# Altium schematic symbol library jlcpcb_2025_04_inductors_extended_0402.schlib: 1396 symbols (part 7 of 8)
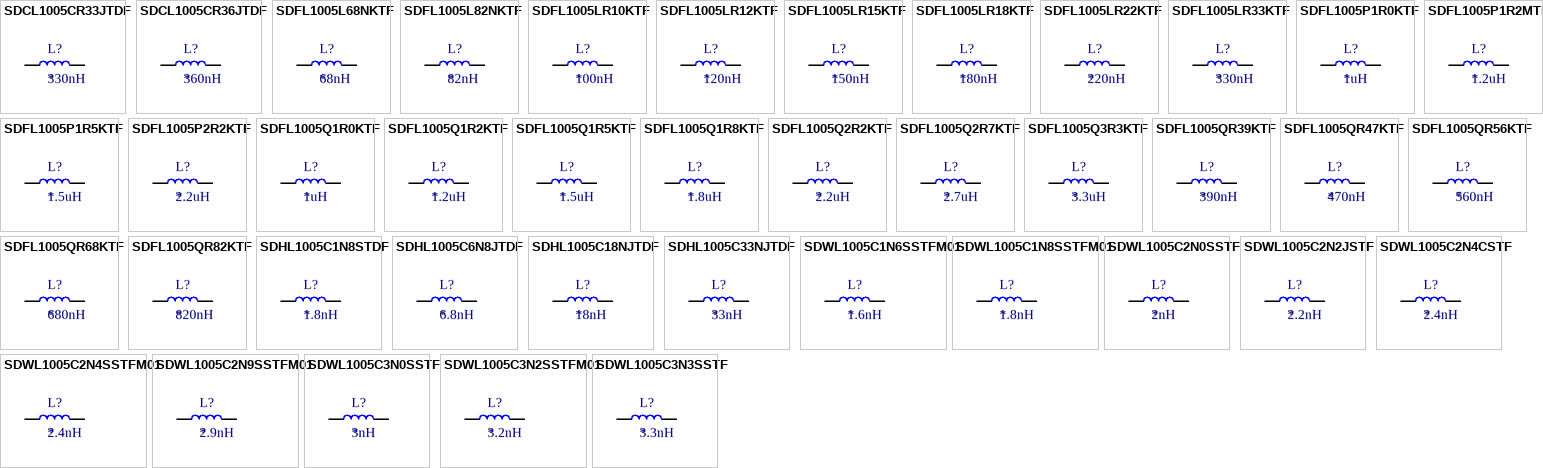
[diagram p40: symbols SDCL1005CR33JTDF to SDWL1005C3N3SSTF]

## SDCL1005CR33JTDF
designator L?  Inductance: 330nH
Inductor, 330nH, ±5%, 7Ω, 50mA, SMD 0402; Manufacturer: Sunlord; Manufacturer Part Number: SDCL1005CR33JTDF; Self-Resonant Frequency: 50MHz; Q Factor: 6@50MHz; Package Size: 0402; JLCPCB Basic Part: No; JLCPCB Part Number: C89954; Supplier 1: LCSC; Category: Inductors; Supplier Part Number 1: C89954; Tolerance: ±5%; Rated Current: 50mA; DC Resistance: 7Ω; RoHS: Yes; ComponentLink1Description: Datasheet; ComponentLink1URL: https://wmsc.lcsc.com/wmsc/upload/file/pdf/v2/lcsc/2310301641_Sunlord-SDCL1005CR33JTDF_C89954.pdf; ComponentLink2Description: JLCPCB Part URL; ComponentLink2URL: https://jlcpcb.com/partdetail/C89954; ComponentLink3Description: LCSC Part URL; ComponentLink3URL: https://lcsc.com/product-detail/Inductors-SMD_Sunlord-Sunlord-SDCL1005CR33JTDF_C89954.html
footprint IND-0402 (0402 (1005M) Inductor)
pins: 1, 2

## SDCL1005CR36JTDF
designator L?  Inductance: 360nH
Inductor, 360nH, ±5%, 7.5Ω, 50mA, SMD 0402; Manufacturer: Sunlord; Manufacturer Part Number: SDCL1005CR36JTDF; Package Size: 0402; JLCPCB Basic Part: No; JLCPCB Part Number: C316414; Supplier 1: LCSC; Category: Inductors; Supplier Part Number 1: C316414; Tolerance: ±5%; Rated Current: 50mA; DC Resistance: 7.5Ω; RoHS: Yes; ComponentLink1Description: Datasheet; ComponentLink1URL: https://wmsc.lcsc.com/wmsc/upload/file/pdf/v2/lcsc/2310301641_Sunlord-SDCL1005CR36JTDF_C316414.pdf; ComponentLink2Description: JLCPCB Part URL; ComponentLink2URL: https://jlcpcb.com/partdetail/C316414; ComponentLink3Description: LCSC Part URL; ComponentLink3URL: https://lcsc.com/product-detail/Inductors-SMD_Sunlord-Sunlord-SDCL1005CR36JTDF_C316414.html
footprint IND-0402 (0402 (1005M) Inductor)
pins: 1, 2

## SDFL1005L68NKTF
designator L?  Inductance: 68nH
Inductor, 68nH, ±10%, 450mΩ, 25mA, SMD 0402; Manufacturer: Sunlord; Manufacturer Part Number: SDFL1005L68NKTF; Self-Resonant Frequency: 50MHz; Q Factor: 10@50MHz; Package Size: 0402; JLCPCB Basic Part: No; JLCPCB Part Number: C370258; Supplier 1: LCSC; Category: Inductors; Supplier Part Number 1: C370258; Tolerance: ±10%; Rated Current: 25mA; DC Resistance: 450mΩ; RoHS: Yes; ComponentLink1Description: Datasheet; ComponentLink1URL: https://wmsc.lcsc.com/wmsc/upload/file/pdf/v2/lcsc/2310271724_Sunlord-SDFL1005L68NKTF_C370258.pdf; ComponentLink2Description: JLCPCB Part URL; ComponentLink2URL: https://jlcpcb.com/partdetail/C370258; ComponentLink3Description: LCSC Part URL; ComponentLink3URL: https://lcsc.com/product-detail/Inductors-SMD_Sunlord-Sunlord-SDFL1005L68NKTF_C370258.html
footprint IND-0402 (0402 (1005M) Inductor)
pins: 1, 2

## SDFL1005L82NKTF
designator L?  Inductance: 82nH
Inductor, 82nH, ±10%, 450mΩ, 25mA, SMD 0402; Manufacturer: Sunlord; Manufacturer Part Number: SDFL1005L82NKTF; Self-Resonant Frequency: 200MHz; Q Factor: 10@50MHz; Package Size: 0402; JLCPCB Basic Part: No; JLCPCB Part Number: C2757904; Supplier 1: LCSC; Category: Inductors; Supplier Part Number 1: C2757904; Tolerance: ±10%; Rated Current: 25mA; DC Resistance: 450mΩ; RoHS: Yes; ComponentLink1Description: Datasheet; ComponentLink1URL: https://wmsc.lcsc.com/wmsc/upload/file/pdf/v2/lcsc/2310301641_Sunlord-SDFL1005L82NKTF_C2757904.pdf; ComponentLink2Description: JLCPCB Part URL; ComponentLink2URL: https://jlcpcb.com/partdetail/C2757904; ComponentLink3Description: LCSC Part URL; ComponentLink3URL: https://lcsc.com/product-detail/Inductors-SMD_Sunlord-Sunlord-SDFL1005L82NKTF_C2757904.html
footprint IND-0402 (0402 (1005M) Inductor)
pins: 1, 2

## SDFL1005LR10KTF
designator L?  Inductance: 100nH
Inductor, 100nH, ±10%, 800mΩ, 25mA, SMD 0402; Manufacturer: Sunlord; Manufacturer Part Number: SDFL1005LR10KTF; Self-Resonant Frequency: 25MHz; Q Factor: 10@25MHz; Package Size: 0402; JLCPCB Basic Part: No; JLCPCB Part Number: C370259; Supplier 1: LCSC; Category: Inductors; Supplier Part Number 1: C370259; Tolerance: ±10%; Rated Current: 25mA; DC Resistance: 800mΩ; RoHS: Yes; ComponentLink1Description: Datasheet; ComponentLink1URL: https://wmsc.lcsc.com/wmsc/upload/file/pdf/v2/lcsc/2310301641_Sunlord-SDFL1005LR10KTF_C370259.pdf; ComponentLink2Description: JLCPCB Part URL; ComponentLink2URL: https://jlcpcb.com/partdetail/C370259; ComponentLink3Description: LCSC Part URL; ComponentLink3URL: https://lcsc.com/product-detail/Inductors-SMD_Sunlord-Sunlord-SDFL1005LR10KTF_C370259.html
footprint IND-0402 (0402 (1005M) Inductor)
pins: 1, 2

## SDFL1005LR12KTF
designator L?  Inductance: 120nH
Inductor, 120nH, ±10%, 800mΩ, 25mA, SMD 0402; Manufacturer: Sunlord; Manufacturer Part Number: SDFL1005LR12KTF; Self-Resonant Frequency: 25MHz; Q Factor: 10@25MHz; Package Size: 0402; JLCPCB Basic Part: No; JLCPCB Part Number: C316412; Supplier 1: LCSC; Category: Inductors; Supplier Part Number 1: C316412; Tolerance: ±10%; Rated Current: 25mA; DC Resistance: 800mΩ; RoHS: Yes; ComponentLink1Description: Datasheet; ComponentLink1URL: https://wmsc.lcsc.com/wmsc/upload/file/pdf/v2/lcsc/2310301641_Sunlord-SDFL1005LR12KTF_C316412.pdf; ComponentLink2Description: JLCPCB Part URL; ComponentLink2URL: https://jlcpcb.com/partdetail/C316412; ComponentLink3Description: LCSC Part URL; ComponentLink3URL: https://lcsc.com/product-detail/Inductors-SMD_Sunlord-Sunlord-SDFL1005LR12KTF_C316412.html
footprint IND-0402 (0402 (1005M) Inductor)
pins: 1, 2

## SDFL1005LR15KTF
designator L?  Inductance: 150nH
Inductor, 150nH, ±10%, 900mΩ, 25mA, SMD 0402; Manufacturer: Sunlord; Manufacturer Part Number: SDFL1005LR15KTF; Self-Resonant Frequency: 25MHz; Q Factor: 10@25MHz; Package Size: 0402; JLCPCB Basic Part: No; JLCPCB Part Number: C316411; Supplier 1: LCSC; Category: Inductors; Supplier Part Number 1: C316411; Tolerance: ±10%; Rated Current: 25mA; DC Resistance: 900mΩ; RoHS: Yes; ComponentLink1Description: Datasheet; ComponentLink1URL: https://wmsc.lcsc.com/wmsc/upload/file/pdf/v2/lcsc/2310301641_Sunlord-SDFL1005LR15KTF_C316411.pdf; ComponentLink2Description: JLCPCB Part URL; ComponentLink2URL: https://jlcpcb.com/partdetail/C316411; ComponentLink3Description: LCSC Part URL; ComponentLink3URL: https://lcsc.com/product-detail/Inductors-SMD_Sunlord-Sunlord-SDFL1005LR15KTF_C316411.html
footprint IND-0402 (0402 (1005M) Inductor)
pins: 1, 2

## SDFL1005LR18KTF
designator L?  Inductance: 180nH
Inductor, 180nH, ±10%, 900mΩ, 25mA, SMD 0402; Manufacturer: Sunlord; Manufacturer Part Number: SDFL1005LR18KTF; Self-Resonant Frequency: 120MHz; Q Factor: 10@25MHz; Package Size: 0402; JLCPCB Basic Part: No; JLCPCB Part Number: C2757903; Supplier 1: LCSC; Category: Inductors; Supplier Part Number 1: C2757903; Tolerance: ±10%; Rated Current: 25mA; DC Resistance: 900mΩ; RoHS: Yes; ComponentLink1Description: Datasheet; ComponentLink1URL: https://wmsc.lcsc.com/wmsc/upload/file/pdf/v2/lcsc/2310301641_Sunlord-SDFL1005LR18KTF_C2757903.pdf; ComponentLink2Description: JLCPCB Part URL; ComponentLink2URL: https://jlcpcb.com/partdetail/C2757903; ComponentLink3Description: LCSC Part URL; ComponentLink3URL: https://lcsc.com/product-detail/Inductors-SMD_Sunlord-Sunlord-SDFL1005LR18KTF_C2757903.html
footprint IND-0402 (0402 (1005M) Inductor)
pins: 1, 2

## SDFL1005LR22KTF
designator L?  Inductance: 220nH
Inductor, 220nH, ±10%, 1.2Ω, 25mA, SMD 0402; Manufacturer: Sunlord; Manufacturer Part Number: SDFL1005LR22KTF; Self-Resonant Frequency: 25MHz; Q Factor: 10@25MHz; Package Size: 0402; JLCPCB Basic Part: No; JLCPCB Part Number: C316410; Supplier 1: LCSC; Category: Inductors; Supplier Part Number 1: C316410; Tolerance: ±10%; Rated Current: 25mA; DC Resistance: 1.2Ω; RoHS: Yes; ComponentLink1Description: Datasheet; ComponentLink1URL: https://wmsc.lcsc.com/wmsc/upload/file/pdf/v2/lcsc/2310301641_Sunlord-SDFL1005LR22KTF_C316410.pdf; ComponentLink2Description: JLCPCB Part URL; ComponentLink2URL: https://jlcpcb.com/partdetail/C316410; ComponentLink3Description: LCSC Part URL; ComponentLink3URL: https://lcsc.com/product-detail/Inductors-SMD_Sunlord-Sunlord-SDFL1005LR22KTF_C316410.html
footprint IND-0402 (0402 (1005M) Inductor)
pins: 1, 2

## SDFL1005LR33KTF
designator L?  Inductance: 330nH
Inductor, 330nH, ±10%, 1.25Ω, 18mA, SMD 0402; Manufacturer: Sunlord; Manufacturer Part Number: SDFL1005LR33KTF; Self-Resonant Frequency: 85MHz; Q Factor: 15@25MHz; Package Size: 0402; JLCPCB Basic Part: No; JLCPCB Part Number: C84477; Supplier 1: LCSC; Category: Inductors; Supplier Part Number 1: C84477; Tolerance: ±10%; Rated Current: 18mA; DC Resistance: 1.25Ω; RoHS: Yes; ComponentLink1Description: Datasheet; ComponentLink1URL: https://wmsc.lcsc.com/wmsc/upload/file/pdf/v2/lcsc/2310301641_Sunlord-SDFL1005LR33KTF_C84477.pdf; ComponentLink2Description: JLCPCB Part URL; ComponentLink2URL: https://jlcpcb.com/partdetail/C84477; ComponentLink3Description: LCSC Part URL; ComponentLink3URL: https://lcsc.com/product-detail/Inductors-SMD_Sunlord-Sunlord-SDFL1005LR33KTF_C84477.html
footprint IND-0402 (0402 (1005M) Inductor)
pins: 1, 2

## SDFL1005P1R0KTF
designator L?  Inductance: 1uH
Inductor, 1uH, ±10%, 1Ω, 15mA, SMD 0402; Manufacturer: Sunlord; Manufacturer Part Number: SDFL1005P1R0KTF; Self-Resonant Frequency: 60MHz; Q Factor: 20@10MHz; Package Size: 0402; JLCPCB Basic Part: No; JLCPCB Part Number: C2880107; Supplier 1: LCSC; Category: Inductors; Supplier Part Number 1: C2880107; Tolerance: ±10%; Rated Current: 15mA; DC Resistance: 1Ω; RoHS: Yes; ComponentLink1Description: Datasheet; ComponentLink1URL: https://wmsc.lcsc.com/wmsc/upload/file/pdf/v2/lcsc/2310301641_Sunlord-SDFL1005P1R0KTF_C2880107.pdf; ComponentLink2Description: JLCPCB Part URL; ComponentLink2URL: https://jlcpcb.com/partdetail/C2880107; ComponentLink3Description: LCSC Part URL; ComponentLink3URL: https://lcsc.com/product-detail/Inductors-SMD_Sunlord-Sunlord-SDFL1005P1R0KTF_C2880107.html
footprint IND-0402 (0402 (1005M) Inductor)
pins: 1, 2

## SDFL1005P1R2MTF
designator L?  Inductance: 1.2uH
Inductor, 1.2uH, ±20%, 1.25Ω, 15mA, SMD 0402; Manufacturer: Sunlord; Manufacturer Part Number: SDFL1005P1R2MTF; Self-Resonant Frequency: 10MHz; Q Factor: 20@10MHz; Package Size: 0402; JLCPCB Basic Part: No; JLCPCB Part Number: C279911; Supplier 1: LCSC; Category: Inductors; Supplier Part Number 1: C279911; Tolerance: ±20%; Rated Current: 15mA; DC Resistance: 1.25Ω; RoHS: Yes; ComponentLink1Description: Datasheet; ComponentLink1URL: https://wmsc.lcsc.com/wmsc/upload/file/pdf/v2/lcsc/2310301641_Sunlord-SDFL1005P1R2MTF_C279911.pdf; ComponentLink2Description: JLCPCB Part URL; ComponentLink2URL: https://jlcpcb.com/partdetail/C279911; ComponentLink3Description: LCSC Part URL; ComponentLink3URL: https://lcsc.com/product-detail/Inductors-SMD_Sunlord-Sunlord-SDFL1005P1R2MTF_C279911.html
footprint IND-0402 (0402 (1005M) Inductor)
pins: 1, 2

## SDFL1005P1R5KTF
designator L?  Inductance: 1.5uH
Inductor, 1.5uH, ±10%, 1.4Ω, 15mA, SMD 0402; Manufacturer: Sunlord; Manufacturer Part Number: SDFL1005P1R5KTF; Self-Resonant Frequency: 10MHz; Q Factor: 20@10MHz; Package Size: 0402; JLCPCB Basic Part: No; JLCPCB Part Number: C370260; Supplier 1: LCSC; Category: Inductors; Supplier Part Number 1: C370260; Tolerance: ±10%; Rated Current: 15mA; DC Resistance: 1.4Ω; RoHS: Yes; ComponentLink1Description: Datasheet; ComponentLink1URL: https://wmsc.lcsc.com/wmsc/upload/file/pdf/v2/lcsc/2310301641_Sunlord-SDFL1005P1R5KTF_C370260.pdf; ComponentLink2Description: JLCPCB Part URL; ComponentLink2URL: https://jlcpcb.com/partdetail/C370260; ComponentLink3Description: LCSC Part URL; ComponentLink3URL: https://lcsc.com/product-detail/Inductors-SMD_Sunlord-Sunlord-SDFL1005P1R5KTF_C370260.html
footprint IND-0402 (0402 (1005M) Inductor)
pins: 1, 2

## SDFL1005P2R2KTF
designator L?  Inductance: 2.2uH
Inductor, 2.2uH, ±10%, 1.7Ω, 10mA, SMD 0402; Manufacturer: Sunlord; Manufacturer Part Number: SDFL1005P2R2KTF; Q Factor: 20@10MHz; Package Size: 0402; JLCPCB Basic Part: No; JLCPCB Part Number: C49067; Supplier 1: LCSC; Category: Inductors; Supplier Part Number 1: C49067; Tolerance: ±10%; Rated Current: 10mA; DC Resistance: 1.7Ω; RoHS: Yes; ComponentLink1Description: Datasheet; ComponentLink1URL: https://wmsc.lcsc.com/wmsc/upload/file/pdf/v2/lcsc/2310301641_Sunlord-SDFL1005P2R2KTF_C49067.pdf; ComponentLink2Description: JLCPCB Part URL; ComponentLink2URL: https://jlcpcb.com/partdetail/C49067; ComponentLink3Description: LCSC Part URL; ComponentLink3URL: https://lcsc.com/product-detail/Inductors-SMD_Sunlord-Sunlord-SDFL1005P2R2KTF_C49067.html
footprint IND-0402 (0402 (1005M) Inductor)
pins: 1, 2

## SDFL1005Q1R0KTF
designator L?  Inductance: 1uH
Inductor, 1uH, ±10%, 1Ω, 15mA, SMD 0402; Manufacturer: Sunlord; Manufacturer Part Number: SDFL1005Q1R0KTF; Self-Resonant Frequency: 40MHz; Q Factor: 20@10MHz; Package Size: 0402; JLCPCB Basic Part: No; JLCPCB Part Number: C84468; Supplier 1: LCSC; Category: Inductors; Supplier Part Number 1: C84468; Tolerance: ±10%; Rated Current: 15mA; DC Resistance: 1Ω; RoHS: Yes; ComponentLink1Description: Datasheet; ComponentLink1URL: https://wmsc.lcsc.com/wmsc/upload/file/pdf/v2/lcsc/2310301641_Sunlord-SDFL1005Q1R0KTF_C84468.pdf; ComponentLink2Description: JLCPCB Part URL; ComponentLink2URL: https://jlcpcb.com/partdetail/C84468; ComponentLink3Description: LCSC Part URL; ComponentLink3URL: https://lcsc.com/product-detail/Inductors-SMD_Sunlord-Sunlord-SDFL1005Q1R0KTF_C84468.html
footprint IND-0402 (0402 (1005M) Inductor)
pins: 1, 2

## SDFL1005Q1R2KTF
designator L?  Inductance: 1.2uH
Inductor, 1.2uH, ±10%, 1.25Ω, 15mA, SMD 0402; Manufacturer: Sunlord; Manufacturer Part Number: SDFL1005Q1R2KTF; Self-Resonant Frequency: 35MHz; Q Factor: 20@10MHz; Package Size: 0402; JLCPCB Basic Part: No; JLCPCB Part Number: C84469; Supplier 1: LCSC; Category: Inductors; Supplier Part Number 1: C84469; Tolerance: ±10%; Rated Current: 15mA; DC Resistance: 1.25Ω; RoHS: Yes; ComponentLink1Description: Datasheet; ComponentLink1URL: https://wmsc.lcsc.com/wmsc/upload/file/pdf/v2/lcsc/2310301641_Sunlord-SDFL1005Q1R2KTF_C84469.pdf; ComponentLink2Description: JLCPCB Part URL; ComponentLink2URL: https://jlcpcb.com/partdetail/C84469; ComponentLink3Description: LCSC Part URL; ComponentLink3URL: https://lcsc.com/product-detail/Inductors-SMD_Sunlord-Sunlord-SDFL1005Q1R2KTF_C84469.html
footprint IND-0402 (0402 (1005M) Inductor)
pins: 1, 2

## SDFL1005Q1R5KTF
designator L?  Inductance: 1.5uH
Inductor, 1.5uH, ±10%, 1.4Ω, 15mA, SMD 0402; Manufacturer: Sunlord; Manufacturer Part Number: SDFL1005Q1R5KTF; Self-Resonant Frequency: 30MHz; Q Factor: 20@10MHz; Package Size: 0402; JLCPCB Basic Part: No; JLCPCB Part Number: C84470; Supplier 1: LCSC; Category: Inductors; Supplier Part Number 1: C84470; Tolerance: ±10%; Rated Current: 15mA; DC Resistance: 1.4Ω; RoHS: Yes; ComponentLink1Description: Datasheet; ComponentLink1URL: https://wmsc.lcsc.com/wmsc/upload/file/pdf/v2/lcsc/2310301641_Sunlord-SDFL1005Q1R5KTF_C84470.pdf; ComponentLink2Description: JLCPCB Part URL; ComponentLink2URL: https://jlcpcb.com/partdetail/C84470; ComponentLink3Description: LCSC Part URL; ComponentLink3URL: https://lcsc.com/product-detail/Inductors-SMD_Sunlord-Sunlord-SDFL1005Q1R5KTF_C84470.html
footprint IND-0402 (0402 (1005M) Inductor)
pins: 1, 2

## SDFL1005Q1R8KTF
designator L?  Inductance: 1.8uH
Inductor, 1.8uH, ±10%, 1.45Ω, 15mA, SMD 0402; Manufacturer: Sunlord; Manufacturer Part Number: SDFL1005Q1R8KTF; Self-Resonant Frequency: 10MHz; Q Factor: 20@10MHz; Package Size: 0402; JLCPCB Basic Part: No; JLCPCB Part Number: C41946; Supplier 1: LCSC; Category: Inductors; Supplier Part Number 1: C41946; Tolerance: ±10%; Rated Current: 15mA; DC Resistance: 1.45Ω; RoHS: Yes; ComponentLink1Description: Datasheet; ComponentLink1URL: https://wmsc.lcsc.com/wmsc/upload/file/pdf/v2/lcsc/2310301641_Sunlord-SDFL1005Q1R8KTF_C41946.pdf; ComponentLink2Description: JLCPCB Part URL; ComponentLink2URL: https://jlcpcb.com/partdetail/C41946; ComponentLink3Description: LCSC Part URL; ComponentLink3URL: https://lcsc.com/product-detail/Inductors-SMD_Sunlord-Sunlord-SDFL1005Q1R8KTF_C41946.html
footprint IND-0402 (0402 (1005M) Inductor)
pins: 1, 2

## SDFL1005Q2R2KTF
designator L?  Inductance: 2.2uH
Inductor, 2.2uH, ±10%, 1.7Ω, 10mA, SMD 0402; Manufacturer: Sunlord; Manufacturer Part Number: SDFL1005Q2R2KTF; Q Factor: 20@10MHz; Package Size: 0402; JLCPCB Basic Part: No; JLCPCB Part Number: C84472; Supplier 1: LCSC; Category: Inductors; Supplier Part Number 1: C84472; Tolerance: ±10%; Rated Current: 10mA; DC Resistance: 1.7Ω; RoHS: Yes; ComponentLink1Description: Datasheet; ComponentLink1URL: https://wmsc.lcsc.com/wmsc/upload/file/pdf/v2/lcsc/2310301641_Sunlord-SDFL1005Q2R2KTF_C84472.pdf; ComponentLink2Description: JLCPCB Part URL; ComponentLink2URL: https://jlcpcb.com/partdetail/C84472; ComponentLink3Description: LCSC Part URL; ComponentLink3URL: https://lcsc.com/product-detail/Inductors-SMD_Sunlord-Sunlord-SDFL1005Q2R2KTF_C84472.html
footprint IND-0402 (0402 (1005M) Inductor)
pins: 1, 2

## SDFL1005Q2R7KTF
designator L?  Inductance: 2.7uH
Inductor, 2.7uH, ±10%, 2.4Ω, 10mA, SMD 0402; Manufacturer: Sunlord; Manufacturer Part Number: SDFL1005Q2R7KTF; Self-Resonant Frequency: 10MHz; Q Factor: 20@10MHz; Package Size: 0402; JLCPCB Basic Part: No; JLCPCB Part Number: C84473; Supplier 1: LCSC; Category: Inductors; Supplier Part Number 1: C84473; Tolerance: ±10%; Rated Current: 10mA; DC Resistance: 2.4Ω; RoHS: Yes; ComponentLink1Description: Datasheet; ComponentLink1URL: https://wmsc.lcsc.com/wmsc/upload/file/pdf/v2/lcsc/2310301641_Sunlord-SDFL1005Q2R7KTF_C84473.pdf; ComponentLink2Description: JLCPCB Part URL; ComponentLink2URL: https://jlcpcb.com/partdetail/C84473; ComponentLink3Description: LCSC Part URL; ComponentLink3URL: https://lcsc.com/product-detail/Inductors-SMD_Sunlord-Sunlord-SDFL1005Q2R7KTF_C84473.html
footprint IND-0402 (0402 (1005M) Inductor)
pins: 1, 2

## SDFL1005Q3R3KTF
designator L?  Inductance: 3.3uH
Inductor, 3.3uH, ±10%, 2.7Ω, 10mA, SMD 0402; Manufacturer: Sunlord; Manufacturer Part Number: SDFL1005Q3R3KTF; Self-Resonant Frequency: 10MHz; Q Factor: 20@10MHz; Package Size: 0402; JLCPCB Basic Part: No; JLCPCB Part Number: C84474; Supplier 1: LCSC; Category: Inductors; Supplier Part Number 1: C84474; Tolerance: ±10%; Rated Current: 10mA; DC Resistance: 2.7Ω; RoHS: Yes; ComponentLink1Description: Datasheet; ComponentLink1URL: https://wmsc.lcsc.com/wmsc/upload/file/pdf/v2/lcsc/2310301641_Sunlord-SDFL1005Q3R3KTF_C84474.pdf; ComponentLink2Description: JLCPCB Part URL; ComponentLink2URL: https://jlcpcb.com/partdetail/C84474; ComponentLink3Description: LCSC Part URL; ComponentLink3URL: https://lcsc.com/product-detail/Inductors-SMD_Sunlord-Sunlord-SDFL1005Q3R3KTF_C84474.html
footprint IND-0402 (0402 (1005M) Inductor)
pins: 1, 2

## SDFL1005QR39KTF
designator L?  Inductance: 390nH
Inductor, 390nH, ±10%, 600mΩ, 15mA, SMD 0402; Manufacturer: Sunlord; Manufacturer Part Number: SDFL1005QR39KTF; Self-Resonant Frequency: 10MHz; Q Factor: 20@10MHz; Package Size: 0402; JLCPCB Basic Part: No; JLCPCB Part Number: C316409; Supplier 1: LCSC; Category: Inductors; Supplier Part Number 1: C316409; Tolerance: ±10%; Rated Current: 15mA; DC Resistance: 600mΩ; RoHS: Yes; ComponentLink1Description: Datasheet; ComponentLink1URL: https://wmsc.lcsc.com/wmsc/upload/file/pdf/v2/lcsc/2310301641_Sunlord-SDFL1005QR39KTF_C316409.pdf; ComponentLink2Description: JLCPCB Part URL; ComponentLink2URL: https://jlcpcb.com/partdetail/C316409; ComponentLink3Description: LCSC Part URL; ComponentLink3URL: https://lcsc.com/product-detail/Inductors-SMD_Sunlord-Sunlord-SDFL1005QR39KTF_C316409.html
footprint IND-0402 (0402 (1005M) Inductor)
pins: 1, 2

## SDFL1005QR47KTF
designator L?  Inductance: 470nH
Inductor, 470nH, ±10%, 700mΩ, 15mA, SMD 0402; Manufacturer: Sunlord; Manufacturer Part Number: SDFL1005QR47KTF; Self-Resonant Frequency: 10MHz; Q Factor: 20@10MHz; Package Size: 0402; JLCPCB Basic Part: No; JLCPCB Part Number: C84476; Supplier 1: LCSC; Category: Inductors; Supplier Part Number 1: C84476; Tolerance: ±10%; Rated Current: 15mA; DC Resistance: 700mΩ; RoHS: Yes; ComponentLink1Description: Datasheet; ComponentLink1URL: https://wmsc.lcsc.com/wmsc/upload/file/pdf/v2/lcsc/2310301641_Sunlord-SDFL1005QR47KTF_C84476.pdf; ComponentLink2Description: JLCPCB Part URL; ComponentLink2URL: https://jlcpcb.com/partdetail/C84476; ComponentLink3Description: LCSC Part URL; ComponentLink3URL: https://lcsc.com/product-detail/Inductors-SMD_Sunlord-Sunlord-SDFL1005QR47KTF_C84476.html
footprint IND-0402 (0402 (1005M) Inductor)
pins: 1, 2

## SDFL1005QR56KTF
designator L?  Inductance: 560nH
Inductor, 560nH, ±10%, 800mΩ, 15mA, SMD 0402; Manufacturer: Sunlord; Manufacturer Part Number: SDFL1005QR56KTF; Self-Resonant Frequency: 10MHz; Q Factor: 20@10MHz; Package Size: 0402; JLCPCB Basic Part: No; JLCPCB Part Number: C20573; Supplier 1: LCSC; Category: Inductors; Supplier Part Number 1: C20573; Tolerance: ±10%; Rated Current: 15mA; DC Resistance: 800mΩ; RoHS: Yes; ComponentLink1Description: Datasheet; ComponentLink1URL: https://wmsc.lcsc.com/wmsc/upload/file/pdf/v2/lcsc/2310301641_Sunlord-SDFL1005QR56KTF_C20573.pdf; ComponentLink2Description: JLCPCB Part URL; ComponentLink2URL: https://jlcpcb.com/partdetail/C20573; ComponentLink3Description: LCSC Part URL; ComponentLink3URL: https://lcsc.com/product-detail/Inductors-SMD_Sunlord-Sunlord-SDFL1005QR56KTF_C20573.html
footprint IND-0402 (0402 (1005M) Inductor)
pins: 1, 2

## SDFL1005QR68KTF
designator L?  Inductance: 680nH
Inductor, 680nH, ±10%, 900mΩ, 15mA, SMD 0402; Manufacturer: Sunlord; Manufacturer Part Number: SDFL1005QR68KTF; Self-Resonant Frequency: 10MHz; Q Factor: 20@10MHz; Package Size: 0402; JLCPCB Basic Part: No; JLCPCB Part Number: C84475; Supplier 1: LCSC; Category: Inductors; Supplier Part Number 1: C84475; Tolerance: ±10%; Rated Current: 15mA; DC Resistance: 900mΩ; RoHS: Yes; ComponentLink1Description: Datasheet; ComponentLink1URL: https://wmsc.lcsc.com/wmsc/upload/file/pdf/v2/lcsc/2310301641_Sunlord-SDFL1005QR68KTF_C84475.pdf; ComponentLink2Description: JLCPCB Part URL; ComponentLink2URL: https://jlcpcb.com/partdetail/C84475; ComponentLink3Description: LCSC Part URL; ComponentLink3URL: https://lcsc.com/product-detail/Inductors-SMD_Sunlord-Sunlord-SDFL1005QR68KTF_C84475.html
footprint IND-0402 (0402 (1005M) Inductor)
pins: 1, 2

## SDFL1005QR82KTF
designator L?  Inductance: 820nH
Inductor, 820nH, ±10%, 900mΩ, 15mA, SMD 0402; Manufacturer: Sunlord; Manufacturer Part Number: SDFL1005QR82KTF; Self-Resonant Frequency: 10MHz; Q Factor: 20@10MHz; Package Size: 0402; JLCPCB Basic Part: No; JLCPCB Part Number: C316408; Supplier 1: LCSC; Category: Inductors; Supplier Part Number 1: C316408; Tolerance: ±10%; Rated Current: 15mA; DC Resistance: 900mΩ; RoHS: Yes; ComponentLink1Description: Datasheet; ComponentLink1URL: https://wmsc.lcsc.com/wmsc/upload/file/pdf/v2/lcsc/2310301641_Sunlord-SDFL1005QR82KTF_C316408.pdf; ComponentLink2Description: JLCPCB Part URL; ComponentLink2URL: https://jlcpcb.com/partdetail/C316408; ComponentLink3Description: LCSC Part URL; ComponentLink3URL: https://lcsc.com/product-detail/Inductors-SMD_Sunlord-Sunlord-SDFL1005QR82KTF_C316408.html
footprint IND-0402 (0402 (1005M) Inductor)
pins: 1, 2

## SDHL1005C1N8STDF
designator L?  Inductance: 1.8nH
Inductor, 1.8nH, 170mΩ, 500mA, SMD 0402; Manufacturer: Sunlord; Manufacturer Part Number: SDHL1005C1N8STDF; Package Size: 0402; JLCPCB Basic Part: No; JLCPCB Part Number: C361622; Supplier 1: LCSC; Category: Inductors; Supplier Part Number 1: C361622; Rated Current: 500mA; DC Resistance: 170mΩ; RoHS: Yes; ComponentLink1Description: Datasheet; ComponentLink1URL: https://wmsc.lcsc.com/wmsc/upload/file/pdf/v2/lcsc/2310301641_Sunlord-SDHL1005C1N8STDF_C361622.pdf; ComponentLink2Description: JLCPCB Part URL; ComponentLink2URL: https://jlcpcb.com/partdetail/C361622; ComponentLink3Description: LCSC Part URL; ComponentLink3URL: https://lcsc.com/product-detail/Inductors-SMD_Sunlord-Sunlord-SDHL1005C1N8STDF_C361622.html
footprint IND-0402 (0402 (1005M) Inductor)
pins: 1, 2

## SDHL1005C6N8JTDF
designator L?  Inductance: 6.8nH
Inductor, 6.8nH, ±5%, 350mΩ, 400mA, SMD 0402; Manufacturer: Sunlord; Manufacturer Part Number: SDHL1005C6N8JTDF; Package Size: 0402; JLCPCB Basic Part: No; JLCPCB Part Number: C316399; Supplier 1: LCSC; Category: Inductors; Supplier Part Number 1: C316399; Tolerance: ±5%; Rated Current: 400mA; DC Resistance: 350mΩ; RoHS: Yes; ComponentLink1Description: Datasheet; ComponentLink1URL: https://wmsc.lcsc.com/wmsc/upload/file/pdf/v2/lcsc/2310301641_Sunlord-SDHL1005C6N8JTDF_C316399.pdf; ComponentLink2Description: JLCPCB Part URL; ComponentLink2URL: https://jlcpcb.com/partdetail/C316399; ComponentLink3Description: LCSC Part URL; ComponentLink3URL: https://lcsc.com/product-detail/Inductors-SMD_Sunlord-Sunlord-SDHL1005C6N8JTDF_C316399.html
footprint IND-0402 (0402 (1005M) Inductor)
pins: 1, 2

## SDHL1005C18NJTDF
designator L?  Inductance: 18nH
Inductor, 18nH, ±5%, 600mΩ, 250mA, SMD 0402; Manufacturer: Sunlord; Manufacturer Part Number: SDHL1005C18NJTDF; Package Size: 0402; JLCPCB Basic Part: No; JLCPCB Part Number: C316400; Supplier 1: LCSC; Category: Inductors; Supplier Part Number 1: C316400; Tolerance: ±5%; Rated Current: 250mA; DC Resistance: 600mΩ; RoHS: Yes; ComponentLink1Description: Datasheet; ComponentLink1URL: https://wmsc.lcsc.com/wmsc/upload/file/pdf/v2/lcsc/2310301641_Sunlord-SDHL1005C18NJTDF_C316400.pdf; ComponentLink2Description: JLCPCB Part URL; ComponentLink2URL: https://jlcpcb.com/partdetail/C316400; ComponentLink3Description: LCSC Part URL; ComponentLink3URL: https://lcsc.com/product-detail/Inductors-SMD_Sunlord-Sunlord-SDHL1005C18NJTDF_C316400.html
footprint IND-0402 (0402 (1005M) Inductor)
pins: 1, 2

## SDHL1005C33NJTDF
designator L?  Inductance: 33nH
Inductor, 33nH, ±5%, 900mΩ, 200mA, SMD 0402; Manufacturer: Sunlord; Manufacturer Part Number: SDHL1005C33NJTDF; Self-Resonant Frequency: 2.5GHz; Q Factor: 5@100MHz; Package Size: 0402; JLCPCB Basic Part: No; JLCPCB Part Number: C2757905; Supplier 1: LCSC; Category: Inductors; Supplier Part Number 1: C2757905; Tolerance: ±5%; Rated Current: 200mA; DC Resistance: 900mΩ; RoHS: Yes; ComponentLink1Description: Datasheet; ComponentLink1URL: https://wmsc.lcsc.com/wmsc/upload/file/pdf/v2/lcsc/2310301641_Sunlord-SDHL1005C33NJTDF_C2757905.pdf; ComponentLink2Description: JLCPCB Part URL; ComponentLink2URL: https://jlcpcb.com/partdetail/C2757905; ComponentLink3Description: LCSC Part URL; ComponentLink3URL: https://lcsc.com/product-detail/Inductors-SMD_Sunlord-Sunlord-SDHL1005C33NJTDF_C2757905.html
footprint IND-0402 (0402 (1005M) Inductor)
pins: 1, 2

## SDWL1005C1N6SSTFM01
designator L?  Inductance: 1.6nH
Inductor, 1.6nH, 70mΩ, 750mA, SMD 0402; Manufacturer: Sunlord; Manufacturer Part Number: SDWL1005C1N6SSTFM01; Package Size: 0402; JLCPCB Basic Part: No; JLCPCB Part Number: C408636; Supplier 1: LCSC; Category: Inductors; Supplier Part Number 1: C408636; Rated Current: 750mA; DC Resistance: 70mΩ; RoHS: Yes; ComponentLink1Description: Datasheet; ComponentLink1URL: https://wmsc.lcsc.com/wmsc/upload/file/pdf/v2/lcsc/2304140030_Sunlord-SDWL1005C1N6SSTFM01_C408636.pdf; ComponentLink2Description: JLCPCB Part URL; ComponentLink2URL: https://jlcpcb.com/partdetail/C408636; ComponentLink3Description: LCSC Part URL; ComponentLink3URL: https://lcsc.com/product-detail/Inductors-SMD_Sunlord-Sunlord-SDWL1005C1N6SSTFM01_C408636.html
footprint IND-0402 (0402 (1005M) Inductor)
pins: 1, 2

## SDWL1005C1N8SSTFM01
designator L?  Inductance: 1.8nH
Inductor, 1.8nH, 160mΩ, 460mA, SMD 0402; Manufacturer: Sunlord; Manufacturer Part Number: SDWL1005C1N8SSTFM01; Package Size: 0402; JLCPCB Basic Part: No; JLCPCB Part Number: C408638; Supplier 1: LCSC; Category: Inductors; Supplier Part Number 1: C408638; Rated Current: 460mA; DC Resistance: 160mΩ; RoHS: Yes; ComponentLink1Description: Datasheet; ComponentLink1URL: https://wmsc.lcsc.com/wmsc/upload/file/pdf/v2/lcsc/2304140030_Sunlord-SDWL1005C1N8SSTFM01_C408638.pdf; ComponentLink2Description: JLCPCB Part URL; ComponentLink2URL: https://jlcpcb.com/partdetail/C408638; ComponentLink3Description: LCSC Part URL; ComponentLink3URL: https://lcsc.com/product-detail/Inductors-SMD_Sunlord-Sunlord-SDWL1005C1N8SSTFM01_C408638.html
footprint IND-0402 (0402 (1005M) Inductor)
pins: 1, 2

## SDWL1005C2N0SSTF
designator L?  Inductance: 2nH
Inductor, 2nH, 43mΩ, 950mA, SMD 0402; Manufacturer: Sunlord; Manufacturer Part Number: SDWL1005C2N0SSTF; Package Size: 0402; JLCPCB Basic Part: No; JLCPCB Part Number: C361506; Supplier 1: LCSC; Category: Inductors; Supplier Part Number 1: C361506; Rated Current: 950mA; DC Resistance: 43mΩ; RoHS: Yes; ComponentLink1Description: Datasheet; ComponentLink1URL: https://wmsc.lcsc.com/wmsc/upload/file/pdf/v2/lcsc/2304140030_Sunlord-SDWL1005C2N0SSTF_C361506.pdf; ComponentLink2Description: JLCPCB Part URL; ComponentLink2URL: https://jlcpcb.com/partdetail/C361506; ComponentLink3Description: LCSC Part URL; ComponentLink3URL: https://lcsc.com/product-detail/Inductors-SMD_Sunlord-Sunlord-SDWL1005C2N0SSTF_C361506.html
footprint IND-0402 (0402 (1005M) Inductor)
pins: 1, 2

## SDWL1005C2N2JSTF
designator L?  Inductance: 2.2nH
Inductor, 2.2nH, ±5%, 58mΩ, 820mA, SMD 0402; Manufacturer: Sunlord; Manufacturer Part Number: SDWL1005C2N2JSTF; Package Size: 0402; JLCPCB Basic Part: No; JLCPCB Part Number: C305133; Supplier 1: LCSC; Category: Inductors; Supplier Part Number 1: C305133; Tolerance: ±5%; Rated Current: 820mA; DC Resistance: 58mΩ; RoHS: Yes; ComponentLink1Description: Datasheet; ComponentLink1URL: https://wmsc.lcsc.com/wmsc/upload/file/pdf/v2/lcsc/2304140030_Sunlord-SDWL1005C2N2JSTF_C305133.pdf; ComponentLink2Description: JLCPCB Part URL; ComponentLink2URL: https://jlcpcb.com/partdetail/C305133; ComponentLink3Description: LCSC Part URL; ComponentLink3URL: https://lcsc.com/product-detail/Inductors-SMD_Sunlord-Sunlord-SDWL1005C2N2JSTF_C305133.html
footprint IND-0402 (0402 (1005M) Inductor)
pins: 1, 2

## SDWL1005C2N4CSTF
designator L?  Inductance: 2.4nH
Inductor, 2.4nH, 91mΩ, 650mA, SMD 0402; Manufacturer: Sunlord; Manufacturer Part Number: SDWL1005C2N4CSTF; Package Size: 0402; JLCPCB Basic Part: No; JLCPCB Part Number: C370299; Supplier 1: LCSC; Category: Inductors; Supplier Part Number 1: C370299; Rated Current: 650mA; DC Resistance: 91mΩ; RoHS: Yes; ComponentLink1Description: Datasheet; ComponentLink1URL: https://wmsc.lcsc.com/wmsc/upload/file/pdf/v2/lcsc/2304140030_Sunlord-SDWL1005C2N4CSTF_C370299.pdf; ComponentLink2Description: JLCPCB Part URL; ComponentLink2URL: https://jlcpcb.com/partdetail/C370299; ComponentLink3Description: LCSC Part URL; ComponentLink3URL: https://lcsc.com/product-detail/Inductors-SMD_Sunlord-Sunlord-SDWL1005C2N4CSTF_C370299.html
footprint IND-0402 (0402 (1005M) Inductor)
pins: 1, 2

## SDWL1005C2N4SSTFM01
designator L?  Inductance: 2.4nH
Inductor, 2.4nH, 50mΩ, 850mA, SMD 0402; Manufacturer: Sunlord; Manufacturer Part Number: SDWL1005C2N4SSTFM01; Package Size: 0402; JLCPCB Basic Part: No; JLCPCB Part Number: C408639; Supplier 1: LCSC; Category: Inductors; Supplier Part Number 1: C408639; Rated Current: 850mA; DC Resistance: 50mΩ; RoHS: Yes; ComponentLink1Description: Datasheet; ComponentLink1URL: https://wmsc.lcsc.com/wmsc/upload/file/pdf/v2/lcsc/2304140030_Sunlord-SDWL1005C2N4SSTFM01_C408639.pdf; ComponentLink2Description: JLCPCB Part URL; ComponentLink2URL: https://jlcpcb.com/partdetail/C408639; ComponentLink3Description: LCSC Part URL; ComponentLink3URL: https://lcsc.com/product-detail/Inductors-SMD_Sunlord-Sunlord-SDWL1005C2N4SSTFM01_C408639.html
footprint IND-0402 (0402 (1005M) Inductor)
pins: 1, 2

## SDWL1005C2N9SSTFM01
designator L?  Inductance: 2.9nH
Inductor, 2.9nH, 70mΩ, 750mA, SMD 0402; Manufacturer: Sunlord; Manufacturer Part Number: SDWL1005C2N9SSTFM01; Package Size: 0402; JLCPCB Basic Part: No; JLCPCB Part Number: C408644; Supplier 1: LCSC; Category: Inductors; Supplier Part Number 1: C408644; Rated Current: 750mA; DC Resistance: 70mΩ; RoHS: Yes; ComponentLink1Description: Datasheet; ComponentLink1URL: https://wmsc.lcsc.com/wmsc/upload/file/pdf/v2/lcsc/2304140030_Sunlord-SDWL1005C2N9SSTFM01_C408644.pdf; ComponentLink2Description: JLCPCB Part URL; ComponentLink2URL: https://jlcpcb.com/partdetail/C408644; ComponentLink3Description: LCSC Part URL; ComponentLink3URL: https://lcsc.com/product-detail/Inductors-SMD_Sunlord-Sunlord-SDWL1005C2N9SSTFM01_C408644.html
footprint IND-0402 (0402 (1005M) Inductor)
pins: 1, 2

## SDWL1005C3N0SSTF
designator L?  Inductance: 3nH
Inductor, 3nH, 63mΩ, 790mA, SMD 0402; Manufacturer: Sunlord; Manufacturer Part Number: SDWL1005C3N0SSTF; Package Size: 0402; JLCPCB Basic Part: No; JLCPCB Part Number: C370302; Supplier 1: LCSC; Category: Inductors; Supplier Part Number 1: C370302; Rated Current: 790mA; DC Resistance: 63mΩ; RoHS: Yes; ComponentLink1Description: Datasheet; ComponentLink1URL: https://wmsc.lcsc.com/wmsc/upload/file/pdf/v2/lcsc/2304140030_Sunlord-SDWL1005C3N0SSTF_C370302.pdf; ComponentLink2Description: JLCPCB Part URL; ComponentLink2URL: https://jlcpcb.com/partdetail/C370302; ComponentLink3Description: LCSC Part URL; ComponentLink3URL: https://lcsc.com/product-detail/Inductors-SMD_Sunlord-Sunlord-SDWL1005C3N0SSTF_C370302.html
footprint IND-0402 (0402 (1005M) Inductor)
pins: 1, 2

## SDWL1005C3N2SSTFM01
designator L?  Inductance: 3.2nH
Inductor, 3.2nH, 170mΩ, 500mA, SMD 0402; Manufacturer: Sunlord; Manufacturer Part Number: SDWL1005C3N2SSTFM01; Package Size: 0402; JLCPCB Basic Part: No; JLCPCB Part Number: C408647; Supplier 1: LCSC; Category: Inductors; Supplier Part Number 1: C408647; Rated Current: 500mA; DC Resistance: 170mΩ; RoHS: Yes; ComponentLink1Description: Datasheet; ComponentLink1URL: https://wmsc.lcsc.com/wmsc/upload/file/pdf/v2/lcsc/2304140030_Sunlord-SDWL1005C3N2SSTFM01_C408647.pdf; ComponentLink2Description: JLCPCB Part URL; ComponentLink2URL: https://jlcpcb.com/partdetail/C408647; ComponentLink3Description: LCSC Part URL; ComponentLink3URL: https://lcsc.com/product-detail/Inductors-SMD_Sunlord-Sunlord-SDWL1005C3N2SSTFM01_C408647.html
footprint IND-0402 (0402 (1005M) Inductor)
pins: 1, 2

## SDWL1005C3N3SSTF
designator L?  Inductance: 3.3nH
Inductor, 3.3nH, 63mΩ, 790mA, SMD 0402; Manufacturer: Sunlord; Manufacturer Part Number: SDWL1005C3N3SSTF; Self-Resonant Frequency: 6GHz; Q Factor: 24@250MHz; Package Size: 0402; JLCPCB Basic Part: No; JLCPCB Part Number: C2757921; Supplier 1: LCSC; Category: Inductors; Supplier Part Number 1: C2757921; Rated Current: 790mA; DC Resistance: 63mΩ; RoHS: Yes; ComponentLink1Description: Datasheet; ComponentLink1URL: https://wmsc.lcsc.com/wmsc/upload/file/pdf/v2/lcsc/2106062245_Sunlord-SDWL1005C3N3SSTF_C2757921.pdf; ComponentLink2Description: JLCPCB Part URL; ComponentLink2URL: https://jlcpcb.com/partdetail/C2757921; ComponentLink3Description: LCSC Part URL; ComponentLink3URL: https://lcsc.com/product-detail/Inductors-SMD_Sunlord-Sunlord-SDWL1005C3N3SSTF_C2757921.html
footprint IND-0402 (0402 (1005M) Inductor)
pins: 1, 2

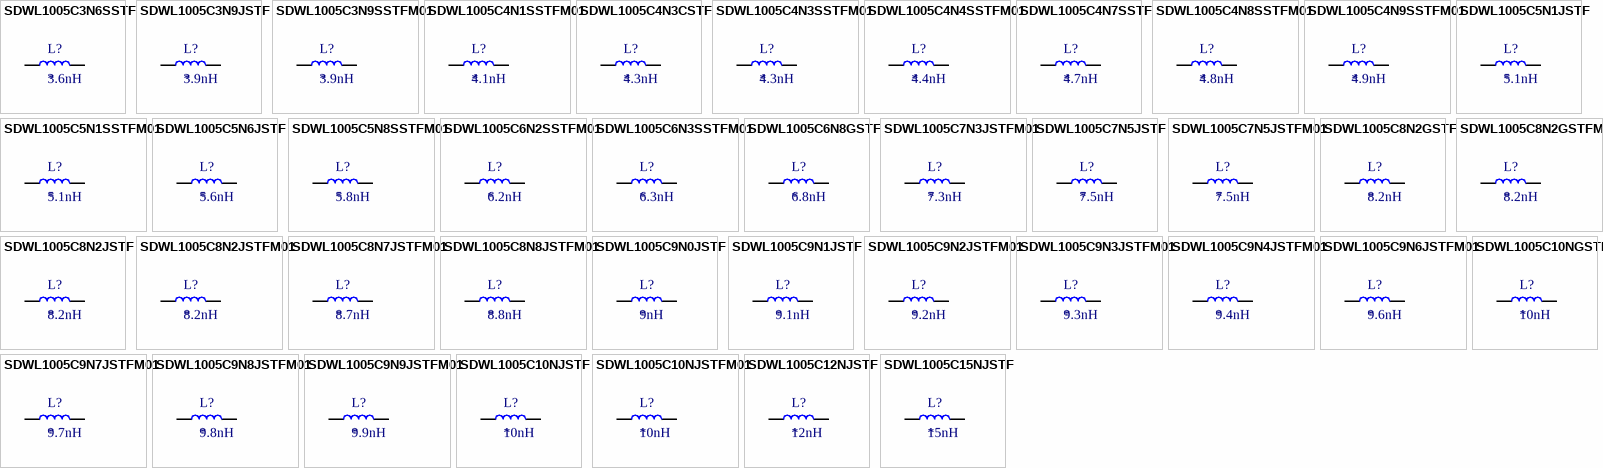
[diagram p30: symbols SDWL1005C3N6SSTF to SDWL1005C15NJSTF]

## SDWL1005C3N6SSTF
designator L?  Inductance: 3.6nH
Inductor, 3.6nH, 63mΩ, 790mA, SMD 0402; Manufacturer: Sunlord; Manufacturer Part Number: SDWL1005C3N6SSTF; Package Size: 0402; JLCPCB Basic Part: No; JLCPCB Part Number: C370305; Supplier 1: LCSC; Category: Inductors; Supplier Part Number 1: C370305; Rated Current: 790mA; DC Resistance: 63mΩ; RoHS: Yes; ComponentLink1Description: Datasheet; ComponentLink1URL: https://wmsc.lcsc.com/wmsc/upload/file/pdf/v2/lcsc/2304140030_Sunlord-SDWL1005C3N6SSTF_C370305.pdf; ComponentLink2Description: JLCPCB Part URL; ComponentLink2URL: https://jlcpcb.com/partdetail/C370305; ComponentLink3Description: LCSC Part URL; ComponentLink3URL: https://lcsc.com/product-detail/Inductors-SMD_Sunlord-Sunlord-SDWL1005C3N6SSTF_C370305.html
footprint IND-0402 (0402 (1005M) Inductor)
pins: 1, 2

## SDWL1005C3N9JSTF
designator L?  Inductance: 3.9nH
Inductor, 3.9nH, ±5%, 63mΩ, 790mA, SMD 0402; Manufacturer: Sunlord; Manufacturer Part Number: SDWL1005C3N9JSTF; Package Size: 0402; JLCPCB Basic Part: No; JLCPCB Part Number: C370307; Supplier 1: LCSC; Category: Inductors; Supplier Part Number 1: C370307; Tolerance: ±5%; Rated Current: 790mA; DC Resistance: 63mΩ; RoHS: Yes; ComponentLink1Description: Datasheet; ComponentLink1URL: https://wmsc.lcsc.com/wmsc/upload/file/pdf/v2/lcsc/2304140030_Sunlord-SDWL1005C3N9JSTF_C370307.pdf; ComponentLink2Description: JLCPCB Part URL; ComponentLink2URL: https://jlcpcb.com/partdetail/C370307; ComponentLink3Description: LCSC Part URL; ComponentLink3URL: https://lcsc.com/product-detail/Inductors-SMD_Sunlord-Sunlord-SDWL1005C3N9JSTF_C370307.html
footprint IND-0402 (0402 (1005M) Inductor)
pins: 1, 2

## SDWL1005C3N9SSTFM01
designator L?  Inductance: 3.9nH
Inductor, 3.9nH, 70mΩ, 750mA, SMD 0402; Manufacturer: Sunlord; Manufacturer Part Number: SDWL1005C3N9SSTFM01; Package Size: 0402; JLCPCB Basic Part: No; JLCPCB Part Number: C408648; Supplier 1: LCSC; Category: Inductors; Supplier Part Number 1: C408648; Rated Current: 750mA; DC Resistance: 70mΩ; RoHS: Yes; ComponentLink1Description: Datasheet; ComponentLink1URL: https://wmsc.lcsc.com/wmsc/upload/file/pdf/v2/lcsc/2304140030_Sunlord-SDWL1005C3N9SSTFM01_C408648.pdf; ComponentLink2Description: JLCPCB Part URL; ComponentLink2URL: https://jlcpcb.com/partdetail/C408648; ComponentLink3Description: LCSC Part URL; ComponentLink3URL: https://lcsc.com/product-detail/Inductors-SMD_Sunlord-Sunlord-SDWL1005C3N9SSTFM01_C408648.html
footprint IND-0402 (0402 (1005M) Inductor)
pins: 1, 2

## SDWL1005C4N1SSTFM01
designator L?  Inductance: 4.1nH
Inductor, 4.1nH, 70mΩ, 750mA, SMD 0402; Manufacturer: Sunlord; Manufacturer Part Number: SDWL1005C4N1SSTFM01; Package Size: 0402; JLCPCB Basic Part: No; JLCPCB Part Number: C408649; Supplier 1: LCSC; Category: Inductors; Supplier Part Number 1: C408649; Rated Current: 750mA; DC Resistance: 70mΩ; RoHS: Yes; ComponentLink1Description: Datasheet; ComponentLink1URL: https://wmsc.lcsc.com/wmsc/upload/file/pdf/v2/lcsc/2304140030_Sunlord-SDWL1005C4N1SSTFM01_C408649.pdf; ComponentLink2Description: JLCPCB Part URL; ComponentLink2URL: https://jlcpcb.com/partdetail/C408649; ComponentLink3Description: LCSC Part URL; ComponentLink3URL: https://lcsc.com/product-detail/Inductors-SMD_Sunlord-Sunlord-SDWL1005C4N1SSTFM01_C408649.html
footprint IND-0402 (0402 (1005M) Inductor)
pins: 1, 2

## SDWL1005C4N3CSTF
designator L?  Inductance: 4.3nH
Inductor, 4.3nH, 70mΩ, 750mA, SMD 0402; Manufacturer: Sunlord; Manufacturer Part Number: SDWL1005C4N3CSTF; Package Size: 0402; JLCPCB Basic Part: No; JLCPCB Part Number: C370308; Supplier 1: LCSC; Category: Inductors; Supplier Part Number 1: C370308; Rated Current: 750mA; DC Resistance: 70mΩ; RoHS: Yes; ComponentLink1Description: Datasheet; ComponentLink1URL: https://wmsc.lcsc.com/wmsc/upload/file/pdf/v2/lcsc/2304140030_Sunlord-SDWL1005C4N3CSTF_C370308.pdf; ComponentLink2Description: JLCPCB Part URL; ComponentLink2URL: https://jlcpcb.com/partdetail/C370308; ComponentLink3Description: LCSC Part URL; ComponentLink3URL: https://lcsc.com/product-detail/Inductors-SMD_Sunlord-Sunlord-SDWL1005C4N3CSTF_C370308.html
footprint IND-0402 (0402 (1005M) Inductor)
pins: 1, 2

## SDWL1005C4N3SSTFM01
designator L?  Inductance: 4.3nH
Inductor, 4.3nH, 70mΩ, 750mA, SMD 0402; Manufacturer: Sunlord; Manufacturer Part Number: SDWL1005C4N3SSTFM01; Package Size: 0402; JLCPCB Basic Part: No; JLCPCB Part Number: C408650; Supplier 1: LCSC; Category: Inductors; Supplier Part Number 1: C408650; Rated Current: 750mA; DC Resistance: 70mΩ; RoHS: Yes; ComponentLink1Description: Datasheet; ComponentLink1URL: https://wmsc.lcsc.com/wmsc/upload/file/pdf/v2/lcsc/2304140030_Sunlord-SDWL1005C4N3SSTFM01_C408650.pdf; ComponentLink2Description: JLCPCB Part URL; ComponentLink2URL: https://jlcpcb.com/partdetail/C408650; ComponentLink3Description: LCSC Part URL; ComponentLink3URL: https://lcsc.com/product-detail/Inductors-SMD_Sunlord-Sunlord-SDWL1005C4N3SSTFM01_C408650.html
footprint IND-0402 (0402 (1005M) Inductor)
pins: 1, 2

## SDWL1005C4N4SSTFM01
designator L?  Inductance: 4.4nH
Inductor, 4.4nH, 70mΩ, 750mA, SMD 0402; Manufacturer: Sunlord; Manufacturer Part Number: SDWL1005C4N4SSTFM01; Package Size: 0402; JLCPCB Basic Part: No; JLCPCB Part Number: C408651; Supplier 1: LCSC; Category: Inductors; Supplier Part Number 1: C408651; Rated Current: 750mA; DC Resistance: 70mΩ; RoHS: Yes; ComponentLink1Description: Datasheet; ComponentLink1URL: https://wmsc.lcsc.com/wmsc/upload/file/pdf/v2/lcsc/2304140030_Sunlord-SDWL1005C4N4SSTFM01_C408651.pdf; ComponentLink2Description: JLCPCB Part URL; ComponentLink2URL: https://jlcpcb.com/partdetail/C408651; ComponentLink3Description: LCSC Part URL; ComponentLink3URL: https://lcsc.com/product-detail/Inductors-SMD_Sunlord-Sunlord-SDWL1005C4N4SSTFM01_C408651.html
footprint IND-0402 (0402 (1005M) Inductor)
pins: 1, 2

## SDWL1005C4N7SSTF
designator L?  Inductance: 4.7nH
Inductor, 4.7nH, 120mΩ, 570mA, SMD 0402; Manufacturer: Sunlord; Manufacturer Part Number: SDWL1005C4N7SSTF; Package Size: 0402; JLCPCB Basic Part: No; JLCPCB Part Number: C316388; Supplier 1: LCSC; Category: Inductors; Supplier Part Number 1: C316388; Rated Current: 570mA; DC Resistance: 120mΩ; RoHS: Yes; ComponentLink1Description: Datasheet; ComponentLink1URL: https://wmsc.lcsc.com/wmsc/upload/file/pdf/v2/lcsc/2304140030_Sunlord-SDWL1005C4N7SSTF_C316388.pdf; ComponentLink2Description: JLCPCB Part URL; ComponentLink2URL: https://jlcpcb.com/partdetail/C316388; ComponentLink3Description: LCSC Part URL; ComponentLink3URL: https://lcsc.com/product-detail/Inductors-SMD_Sunlord-Sunlord-SDWL1005C4N7SSTF_C316388.html
footprint IND-0402 (0402 (1005M) Inductor)
pins: 1, 2

## SDWL1005C4N8SSTFM01
designator L?  Inductance: 4.8nH
Inductor, 4.8nH, 70mΩ, 750mA, SMD 0402; Manufacturer: Sunlord; Manufacturer Part Number: SDWL1005C4N8SSTFM01; Package Size: 0402; JLCPCB Basic Part: No; JLCPCB Part Number: C408655; Supplier 1: LCSC; Category: Inductors; Supplier Part Number 1: C408655; Rated Current: 750mA; DC Resistance: 70mΩ; RoHS: Yes; ComponentLink1Description: Datasheet; ComponentLink1URL: https://wmsc.lcsc.com/wmsc/upload/file/pdf/v2/lcsc/2304140030_Sunlord-SDWL1005C4N8SSTFM01_C408655.pdf; ComponentLink2Description: JLCPCB Part URL; ComponentLink2URL: https://jlcpcb.com/partdetail/C408655; ComponentLink3Description: LCSC Part URL; ComponentLink3URL: https://lcsc.com/product-detail/Inductors-SMD_Sunlord-Sunlord-SDWL1005C4N8SSTFM01_C408655.html
footprint IND-0402 (0402 (1005M) Inductor)
pins: 1, 2

## SDWL1005C4N9SSTFM01
designator L?  Inductance: 4.9nH
Inductor, 4.9nH, 120mΩ, 600mA, SMD 0402; Manufacturer: Sunlord; Manufacturer Part Number: SDWL1005C4N9SSTFM01; Package Size: 0402; JLCPCB Basic Part: No; JLCPCB Part Number: C408656; Supplier 1: LCSC; Category: Inductors; Supplier Part Number 1: C408656; Rated Current: 600mA; DC Resistance: 120mΩ; RoHS: Yes; ComponentLink1Description: Datasheet; ComponentLink1URL: https://wmsc.lcsc.com/wmsc/upload/file/pdf/v2/lcsc/2304140030_Sunlord-SDWL1005C4N9SSTFM01_C408656.pdf; ComponentLink2Description: JLCPCB Part URL; ComponentLink2URL: https://jlcpcb.com/partdetail/C408656; ComponentLink3Description: LCSC Part URL; ComponentLink3URL: https://lcsc.com/product-detail/Inductors-SMD_Sunlord-Sunlord-SDWL1005C4N9SSTFM01_C408656.html
footprint IND-0402 (0402 (1005M) Inductor)
pins: 1, 2

## SDWL1005C5N1JSTF
designator L?  Inductance: 5.1nH
Inductor, 5.1nH, ±5%, 100mΩ, 620mA, SMD 0402; Manufacturer: Sunlord; Manufacturer Part Number: SDWL1005C5N1JSTF; Package Size: 0402; JLCPCB Basic Part: No; JLCPCB Part Number: C391210; Supplier 1: LCSC; Category: Inductors; Supplier Part Number 1: C391210; Tolerance: ±5%; Rated Current: 620mA; DC Resistance: 100mΩ; RoHS: Yes; ComponentLink1Description: Datasheet; ComponentLink1URL: https://wmsc.lcsc.com/wmsc/upload/file/pdf/v2/lcsc/2304140030_Sunlord-SDWL1005C5N1JSTF_C391210.pdf; ComponentLink2Description: JLCPCB Part URL; ComponentLink2URL: https://jlcpcb.com/partdetail/C391210; ComponentLink3Description: LCSC Part URL; ComponentLink3URL: https://lcsc.com/product-detail/Inductors-SMD_Sunlord-Sunlord-SDWL1005C5N1JSTF_C391210.html
footprint IND-0402 (0402 (1005M) Inductor)
pins: 1, 2
